# Altium footprint library TYCO THD.PcbLib: 146 footprints (part 10 of 11) (continued)
## TYCO_5747844-5 [mm] "Right Angle 9 Female Contacts D-SUB Connector With PCB Mount Retention , Grounding Straps, and Fixed UNC 4-40 Female Screwlocks" (continued)
  text "9" at 5.75,0.925 h1.2
  text "1" at -7.35,-1.575 h1.2
  text "5" at 6.85,-1.575 h1.2
  text "6" at -6.375,0.925 h1.2
3D body "TYCO_5747844-5.stp": height 12.55, standoff -3.26, extent -15.494,-3.185 15.494,15.71

## TYCO_5748481-6 [mm] "26 Female Contacts, Right Angle High Density D-SUB Connector With Boardlock and 4-40 UNC Female Screwlocks, AMPLIMITE HD-22 Serie"
height 12.75
pads (28):
  round 1.7 hole 1.2: 1(-8.64,-2.54) 2(-6.35,-2.54) 3(-4.06,-2.54) 4(-1.77,-2.54) 5(0.52,-2.54) 6(2.81,-2.54) 7(5.1,-2.54) 8(7.39,-2.54) 9(9.68,-2.54) 10(-9.78,0) 11(-7.49,0) 12(-5.2,0) 13(-2.91,0) 14(-0.62,0) 15(1.67,0) 16(3.96,0) 17(6.25,0) 18(8.54,0) 19(-8.64,2.54) 20(-6.35,2.54) 21(-4.06,2.54) 22(-1.77,2.54) 23(0.52,2.54) 24(2.81,2.54) 25(5.1,2.54) 26(7.39,2.54)
  round 3.9 hole 3.2: 27(-16.66,0) 28(16.66,0)
Top Overlay:
  lines w0.2: -19.6,2.53 -18.285,2.53 -18.285,1.698 ; -19.6,7.33 -13.55,7.33 -13.55,-3.63 ; -19.6,8.53 19.6,8.53 ; -19.6,11.03 19.6,11.03 ; -19.06,11.43 -19.06,17.43 -14.26,17.43 -14.26,11.43 ; -15.035,1.698 -15.035,2.53 -13.55,2.53 ; -13.32,11.43 ccw(c-13.32,12.43) -12.32,12.43 -12.32,16.45 cw(c-11.47,16.45) -11.47,17.3 11.47,17.3 cw(c11.47,16.45) 12.32,16.45 12.32,12.43 ccw(c13.32,12.43) 13.32,11.43 ; -9.436,-3.63 -19.6,-3.63 -19.6,11.43 19.6,11.43 19.6,-3.63 10.476,-3.63 ; 13.55,-3.63 13.55,7.33 19.6,7.33 ; 13.55,2.53 15.035,2.53 15.035,1.698 ; 14.26,11.43 14.26,17.43 19.06,17.43 19.06,11.43 ; 18.285,1.698 18.285,2.53 19.6,2.53
  text "9" at 11.25,-3.04 h1.2
  text "26" at 10.175,1.94 h1.2
  text "18" at 10.175,-0.6 h1.2
  text "10" at -12.95,-0.675 h1.2
  text "19" at -12.95,1.865 h1.2
  text "1" at -11.95,-3 h1.2
Mechanical 8:
  lines w0.1: -17.16,0 -16.66,0 ; -16.66,-0.5 -16.66,0 ; -16.66,0.5 -16.66,0 ; -16.16,0 -16.66,0 ; -10.28,0 -9.78,0 ; -9.78,-0.5 -9.78,0 ; -9.78,0.5 -9.78,0 ; -9.28,0 -9.78,0 ; -9.14,-2.54 -8.64,-2.54 ; -9.14,2.54 -8.64,2.54 ; -8.64,-3.04 -8.64,-2.54 ; -8.64,-2.04 -8.64,-2.54 ; -8.64,2.04 -8.64,2.54 ; -8.64,3.04 -8.64,2.54 ; -8.14,-2.54 -8.64,-2.54 ; -8.14,2.54 -8.64,2.54 ; -7.99,0 -7.49,0 ; -7.49,-0.5 -7.49,0 ; -7.49,0.5 -7.49,0 ; -6.99,0 -7.49,0 ; -6.85,-2.54 -6.35,-2.54 ; -6.85,2.54 -6.35,2.54 ; -6.35,-3.04 -6.35,-2.54 ; -6.35,-2.04 -6.35,-2.54 ; -6.35,2.04 -6.35,2.54 ; -6.35,3.04 -6.35,2.54 ; -5.85,-2.54 -6.35,-2.54 ; -5.85,2.54 -6.35,2.54 ; -5.7,0 -5.2,0 ; -5.2,-0.5 -5.2,0 ; -5.2,0.5 -5.2,0 ; -4.7,0 -5.2,0 ; -4.56,-2.54 -4.06,-2.54 ; -4.56,2.54 -4.06,2.54 ; -4.06,-3.04 -4.06,-2.54 ; -4.06,-2.04 -4.06,-2.54 ; -4.06,2.04 -4.06,2.54 ; -4.06,3.04 -4.06,2.54 ; -3.56,-2.54 -4.06,-2.54 ; -3.56,2.54 -4.06,2.54 ; -3.41,0 -2.91,0 ; -2.91,-0.5 -2.91,0 ; -2.91,0.5 -2.91,0 ; -2.41,0 -2.91,0 ; -2.27,-2.54 -1.77,-2.54 ; -2.27,2.54 -1.77,2.54 ; -1.77,-3.04 -1.77,-2.54 ; -1.77,-2.04 -1.77,-2.54 ; -1.77,2.04 -1.77,2.54 ; -1.77,3.04 -1.77,2.54 ; -1.27,-2.54 -1.77,-2.54 ; -1.27,2.54 -1.77,2.54 ; -1.12,0 -0.62,0 ; -0.62,-0.5 -0.62,0 ; -0.62,0.5 -0.62,0 ; -0.354,-0.354 0,0 ; -0.354,0.354 0,0 ; 0.02,-2.54 0.52,-2.54 ; 0.02,2.54 0.52,2.54 ; 0.354,-0.354 0,0 ; 0.354,0.354 0,0 ; 0.52,-3.04 0.52,-2.54 ; 0.52,-2.04 0.52,-2.54 ; 0.52,2.04 0.52,2.54 ; 0.52,3.04 0.52,2.54 ; 1.02,-2.54 0.52,-2.54 ; 1.02,2.54 0.52,2.54 ; 1.17,0 1.67,0 ; 1.67,-0.5 1.67,0 ; 1.67,0.5 1.67,0 ; 2.17,0 1.67,0 ; 2.31,-2.54 2.81,-2.54 ; 2.31,2.54 2.81,2.54 ; 2.81,-3.04 2.81,-2.54 ; 2.81,-2.04 2.81,-2.54 ; 2.81,2.04 2.81,2.54 ; 2.81,3.04 2.81,2.54 ; 3.31,-2.54 2.81,-2.54 ; 3.31,2.54 2.81,2.54 ; 3.46,0 3.96,0 ; 3.96,-0.5 3.96,0 ; 3.96,0.5 3.96,0 ; 4.46,0 3.96,0 ; 4.6,-2.54 5.1,-2.54 ; 4.6,2.54 5.1,2.54 ; 5.1,-3.04 5.1,-2.54 ; 5.1,-2.04 5.1,-2.54 ; 5.1,2.04 5.1,2.54 ; 5.1,3.04 5.1,2.54 ; 5.6,-2.54 5.1,-2.54 ; 5.6,2.54 5.1,2.54 ; 5.75,0 6.25,0 ; 6.25,-0.5 6.25,0 ; 6.25,0.5 6.25,0 ; 6.75,0 6.25,0 ; 6.89,-2.54 7.39,-2.54 ; 6.89,2.54 7.39,2.54 ; 7.39,-3.04 7.39,-2.54 ; 7.39,-2.04 7.39,-2.54 ; 7.39,2.04 7.39,2.54 ; 7.39,3.04 7.39,2.54 ; 7.89,-2.54 7.39,-2.54 ; 7.89,2.54 7.39,2.54 ; 8.04,0 8.54,0 ; 8.54,-0.5 8.54,0 ; 8.54,0.5 8.54,0 ; 9.04,0 8.54,0 ; 9.18,-2.54 9.68,-2.54 ; 9.68,-3.04 9.68,-2.54 ; 9.68,-2.04 9.68,-2.54 ; 10.18,-2.54 9.68,-2.54 ; 16.16,0 16.66,0 ; 16.66,-0.5 16.66,0 ; 16.66,0.5 16.66,0 ; 17.16,0 16.66,0
Mechanical 14:
  lines w0.1: -19.6,2.53 -18.285,2.53 -18.285,-0.3 ; -19.6,7.33 -13.55,7.33 -13.55,-3.63 ; -19.6,8.53 19.6,8.53 ; -19.6,11.03 19.6,11.03 ; -19.06,11.43 -19.06,17.43 -14.26,17.43 -14.26,11.43 ; -18.285,0.3 -18.535,0.3 -18.535,0.625 cw(c-16.66,0.625) -18.285,1.56 ; -17.16,2.03 -17.16,-0.3 -18.285,-0.3 ; -17.154,1.951 cw(c-16.658,2.001) -16.16,2.03 -16.16,-0.3 -15.035,-0.3 ; -15.035,0.3 -14.785,0.3 -14.785,0.625 ccw(c-16.66,0.625) -15.035,1.56 ; -13.55,2.53 -15.035,2.53 -15.035,-0.3 ; -13.32,11.43 ccw(c-13.32,12.43) -12.32,12.43 -12.32,16.45 cw(c-11.47,16.45) -11.47,17.3 11.47,17.3 cw(c11.47,16.45) 12.32,16.45 12.32,12.43 ccw(c13.32,12.43) 13.32,11.43 ; 13.55,-3.63 13.55,7.33 19.6,7.33 ; 13.55,2.53 15.035,2.53 15.035,-0.3 ; 14.26,11.43 14.26,17.43 19.06,17.43 19.06,11.43 ; 15.035,0.3 14.785,0.3 14.785,0.625 cw(c16.66,0.625) 15.035,1.56 ; 18.285,0.3 18.535,0.3 18.535,0.625 ccw(c16.66,0.625) 18.285,1.56 ; 19.6,2.53 18.285,2.53 18.285,-0.3 ; -18.285,-0.3 -18.535,-0.3 -18.535,-0.625 ccw(c-16.66,-0.625) -14.785,-0.625 -14.785,-0.3 -15.035,-0.3 ; 15.035,-0.3 16.16,-0.3 16.16,2.03 cw(c16.66,2.03) 17.16,2.03 17.16,-0.3 18.285,-0.3 ; 15.035,-0.3 14.785,-0.3 14.785,-0.625 ccw(c16.66,-0.625) 18.535,-0.625 18.535,-0.3 18.285,-0.3 ; -19.6,-3.63 19.6,-3.63 19.6,11.43 -19.6,11.43 -19.6,-3.63
3D body "TYCO_5748481-6.stp": height 12.5, standoff -4.35, extent -19.6,-3.63 19.6,17.43

## TYCO_5748483-5 [mm] "Right Angle D-SUB 78 Female Contacts, Shell Size 5, With Boardlock and Threaded Insert,(4-40 UNC), HD-22 Serie"
height 15.55
pads (80):
  round 1.9 hole 1.2: 1(22.87,3.965) 2(20.46,3.965) 3(18.05,3.965) 4(15.64,3.965) 5(13.23,3.965) 6(10.82,3.965) 7(8.41,3.965) 8(6,3.965) 9(3.59,3.965) 10(1.18,3.965) 11(-1.23,3.965) 12(-3.64,3.965) 13(-6.05,3.965) 14(-8.46,3.965) 15(-10.87,3.965) 16(-13.28,3.965) 17(-15.69,3.965) 18(-18.1,3.965) 19(-20.51,3.965) 20(-22.92,3.965) 21(21.67,1.425) 22(19.26,1.425) 23(16.85,1.425) 24(14.44,1.425) 25(12.03,1.425) 26(9.62,1.425) 27(7.21,1.425) 28(4.8,1.425) 29(2.39,1.425) 30(-0.02,1.425) 31(-2.43,1.425) 32(-4.84,1.425) 33(-7.25,1.425) 34(-9.66,1.425) 35(-12.07,1.425) 36(-14.48,1.425) 37(-16.89,1.425) 38(-19.3,1.425) 39(-21.71,1.425) 40(22.87,-1.115) 41(20.46,-1.115) 42(18.05,-1.115) 43(15.64,-1.115) 44(13.23,-1.115) 45(10.82,-1.115) 46(8.41,-1.115) 47(6,-1.115) 48(3.59,-1.115) 49(1.18,-1.115) 50(-1.23,-1.115) 51(-3.64,-1.115) 52(-6.05,-1.115) 53(-8.46,-1.115) 54(-10.87,-1.115) 55(-13.28,-1.115) 56(-15.69,-1.115) 57(-18.1,-1.115) 58(-20.51,-1.115) 59(-22.92,-1.115) 60(21.67,-3.655) 61(19.26,-3.655) 62(16.85,-3.655) 63(14.44,-3.655) 64(12.03,-3.655) 65(9.62,-3.655) 66(7.21,-3.655) 67(4.8,-3.655) 68(2.39,-3.655) 69(-0.02,-3.655) 70(-2.43,-3.655) 71(-4.84,-3.655) 72(-7.25,-3.655) 73(-9.66,-3.655) 74(-12.07,-3.655) 75(-14.48,-3.655) 76(-16.89,-3.655) 77(-19.3,-3.655) 78(-21.71,-3.655)
  round 5.5 hole 3.2: 79(-30.55,-1.115) 80(30.5,-1.115)
Top Overlay:
  lines w0.2: -33.5,-9.405 33.5,-9.405 ; -33.5,-8.645 -27.47,-8.645 -27.47,-1.775 ; -33.5,-2.22 -33.5,-12.545 33.5,-12.545 33.5,-2.075 ; -33.5,-0.01 -33.5,5.055 -23.717,5.055 ; -33,-8.645 -33,-3.095 ; -32.325,1.487 -32.325,5.055 ; -31.925,-12.545 -31.925,-9.405 ; -28.675,1.416 -28.675,5.055 ; -28,-8.645 -28,-2.964 ; -27.47,-0.455 -27.47,5.055 ; -26.913,-12.545 cw(c-26.913,-13.358) -26.1,-13.358 ; -23.052,-18.645 -23.052,-12.545 ; 22,-18.645 22,-18.745 22.75,-18.745 22.75,-18.645 ; 22.021,-18.745 22.021,-18.645 ; 22.063,-18.745 22.063,-18.645 ; 22.125,-18.745 22.125,-18.645 ; 22.229,-18.745 22.229,-18.645 ; 22.333,-18.745 22.333,-18.645 ; 22.417,-18.745 22.417,-18.645 ; 22.521,-18.745 22.521,-18.645 ; 22.625,-18.745 22.625,-18.645 ; 22.688,-18.745 22.688,-18.645 ; 22.708,-18.745 22.708,-18.645 ; 22.8,-18.645 22.8,-18.745 23.967,-18.745 23.967,-18.645 ; 22.821,-18.745 22.821,-18.645 ; 22.842,-18.745 22.842,-18.645 ; 22.925,-18.745 22.925,-18.645 ; 23.008,-18.745 23.008,-18.645 ; 23.052,-18.645 23.052,-12.545 ; 23.154,-18.745 23.154,-18.645 ; 23.238,-18.745 23.238,-18.645 ; 23.363,-18.745 23.363,-18.645 ; 23.446,-18.745 23.446,-18.645 ; 23.529,-18.745 23.529,-18.645 ; 23.55,-18.745 23.55,-18.645 ; 23.625,-18.745 23.625,-18.645 ; 23.667,5.055 33.5,5.055 33.5,-0.155 ; 23.717,-18.745 23.717,-18.645 ; 23.842,-18.745 23.842,-18.645 ; 24,-18.645 24,-18.745 24.75,-18.745 24.75,-18.645 ; 24.021,-18.745 24.021,-18.645 ; 24.042,-18.745 24.042,-18.645 ; 24.083,-18.745 24.083,-18.645 ; 24.1,-18.745 24.1,-18.645 ; 24.225,-18.745 24.225,-18.645 ; 24.35,-18.745 24.35,-18.645 ; 24.375,-18.745 24.375,-18.645 ; 24.5,-18.745 24.5,-18.645 ; 24.604,-18.745 24.604,-18.645 ; 24.667,-18.745 24.667,-18.645 ; 24.708,-18.745 24.708,-18.645 ; 24.729,-18.745 24.729,-18.645 ; 26.913,-12.545 ccw(c26.913,-13.358) 26.1,-13.358 ; 27.47,-1.976 27.47,-8.645 33.5,-8.645 ; 27.47,-0.254 27.47,5.055 ; 28,-8.645 28,-3.031 ; 28.675,1.452 28.675,5.055 ; 31.925,-12.545 31.925,-9.405 ; 32.325,1.452 32.325,5.055 ; 33,-8.645 33,-3.031 ; -26.1,-17.82 ccw(c-24.83,-17.82) -25.795,-18.645 25.795,-18.645 ccw(c24.83,-17.82) 26.1,-17.82 ; -26.1,-17.82 26.1,-17.82 ; -26.1,-17.82 -26.1,-13.358 ; -26.1,-13.358 26.1,-13.358 ; 26.1,-17.82 26.1,-13.358
  text "20" at -26.629,2.923 h1.2
  text "78" at -25.954,-4.44 h1.2
  text "1" at 24.846,2.963 h1.2
  text "39" at -25.979,0.56 h1.2
  text "59" at -26.733,-1.94 h1.2
  text "21" at 23.596,0.623 h1.2
  text "40" at 24.471,-1.827 h1.2
  text "60" at 23.446,-4.402 h1.2
Mechanical 8:
  drawing of 168 lines, arcs and shapes, not listed
Mechanical 14:
  lines w0.1: -33.5,-9.405 33.5,-9.405 ; -33.5,-8.645 -27.47,-8.645 -27.47,5.055 ; -33,-8.645 -33,-1.115 -31.5,-1.115 -31.5,-0.815 ; -32.325,-1.115 -32.325,5.055 ; -32.325,-0.39 cw(c-30.5,-0.39) -28.675,-0.39 ; -32.155,-1.115 -32.155,-0.815 -30.775,-0.815 -30.775,-1.115 -30.225,-1.115 -30.225,-0.815 -28.845,-0.815 -28.845,-1.115 ; -31.925,-12.545 -31.925,-9.405 ; -31.764,-1.115 -31.764,-0.815 ; -31.68,-1.115 -31.68,-0.815 ; -29.5,-0.815 -29.5,-1.115 -28,-1.115 -28,-8.645 ; -29.32,-1.115 -29.32,-0.815 ; -29.236,-1.115 -29.236,-0.815 ; -28.675,-1.115 -28.675,5.055 ; -26.913,-12.545 cw(c-26.913,-13.358) -26.1,-13.358 ; -23.052,-18.645 -23.052,-12.545 ; 22,-18.645 22,-18.745 22.75,-18.745 22.75,-18.645 ; 22.021,-18.745 22.021,-18.645 ; 22.063,-18.745 22.063,-18.645 ; 22.125,-18.745 22.125,-18.645 ; 22.229,-18.745 22.229,-18.645 ; 22.333,-18.745 22.333,-18.645 ; 22.417,-18.745 22.417,-18.645 ; 22.521,-18.745 22.521,-18.645 ; 22.625,-18.745 22.625,-18.645 ; 22.688,-18.745 22.688,-18.645 ; 22.708,-18.745 22.708,-18.645 ; 22.8,-18.645 22.8,-18.745 23.967,-18.745 23.967,-18.645 ; 22.821,-18.745 22.821,-18.645 ; 22.842,-18.745 22.842,-18.645 ; 22.925,-18.745 22.925,-18.645 ; 23.008,-18.745 23.008,-18.645 ; 23.052,-18.645 23.052,-12.545 ; 23.154,-18.745 23.154,-18.645 ; 23.238,-18.745 23.238,-18.645 ; 23.363,-18.745 23.363,-18.645 ; 23.446,-18.745 23.446,-18.645 ; 23.529,-18.745 23.529,-18.645 ; 23.55,-18.745 23.55,-18.645 ; 23.625,-18.745 23.625,-18.645 ; 23.717,-18.745 23.717,-18.645 ; 23.842,-18.745 23.842,-18.645 ; 24,-18.645 24,-18.745 24.75,-18.745 24.75,-18.645 ; 24.021,-18.745 24.021,-18.645 ; 24.042,-18.745 24.042,-18.645 ; 24.083,-18.745 24.083,-18.645 ; 24.1,-18.745 24.1,-18.645 ; 24.225,-18.745 24.225,-18.645 ; 24.35,-18.745 24.35,-18.645 ; 24.375,-18.745 24.375,-18.645 ; 24.5,-18.745 24.5,-18.645 ; 24.604,-18.745 24.604,-18.645 ; 24.667,-18.745 24.667,-18.645 ; 24.708,-18.745 24.708,-18.645 ; 24.729,-18.745 24.729,-18.645 ; 26.913,-12.545 ccw(c26.913,-13.358) 26.1,-13.358 ; 27.47,5.055 27.47,-8.645 33.5,-8.645 ; 28,-8.645 28,-1.115 29.5,-1.115 29.5,-0.815 ; 28.675,-1.115 28.675,5.055 ; 28.675,-0.39 cw(c30.5,-0.39) 32.325,-0.39 ; 28.845,-1.115 28.845,-0.815 30.225,-0.815 30.225,-1.115 30.775,-1.115 30.775,-0.815 32.155,-0.815 32.155,-1.115 ; 29.236,-1.115 29.236,-0.815 ; 29.32,-1.115 29.32,-0.815 ; 31.5,-0.815 31.5,-1.115 33,-1.115 33,-8.645 ; 31.68,-1.115 31.68,-0.815 ; 31.764,-1.115 31.764,-0.815 ; 31.925,-12.545 31.925,-9.405 ; 32.325,-1.115 32.325,5.055 ; -26.1,-17.82 ccw(c-24.83,-17.82) -25.795,-18.645 25.795,-18.645 ccw(c24.83,-17.82) 26.1,-17.82 ; -26.1,-17.82 26.1,-17.82 ; -26.1,-17.82 -26.1,-13.358 ; -26.1,-13.358 26.1,-13.358 ; 26.1,-17.82 26.1,-13.358 ; -33.5,-12.545 33.5,-12.545 33.5,5.055 -33.5,5.055 -33.5,-12.545
  text "20" at -26.629,2.923 h1.2
  text "78" at -25.954,-4.44 h1.2
  text "1" at 24.846,2.963 h1.2
  text "39" at -25.979,0.56 h1.2
  text "59" at -26.733,-1.94 h1.2
  text "21" at 23.596,0.623 h1.2
  text "40" at 24.471,-1.827 h1.2
  text "60" at 23.446,-4.402 h1.2
3D body "TYCO_5748483-5.stp": height 15.3, standoff -3.5, extent -33.5,-18.745 33.5,5.055

## TYCO_5749768-1 [mm] "15 Male Contacts, Right Angle High Density D-SUB Connector With Boardlock and Threaded Insert (4-40 UNC), AMPLIMITE HD-22 Series"
height 12.88
pads (17):
  round 1.7 hole 1.2: 1(4.33,-2.54) 2(2.04,-2.54) 3(-0.25,-2.54) 4(-2.54,-2.54) 5(-4.83,-2.54) 6(5.47,0) 7(3.18,0) 8(0.89,0) 9(-1.4,0) 10(-3.69,0) 11(4.33,2.54) 12(2.04,2.54) 13(-0.25,2.54) 14(-2.54,2.54) 15(-4.83,2.54)
  round 3.9 hole 3.2: 16(-12.5,0) 17(12.49,0)
Top Overlay:
  lines w0.2: -15.41,7.18 -9.305,7.18 -9.305,-3.63 ; -15.41,9.03 15.4,9.03 ; -15.1,7.18 -15.1,6.73 ccw(c-14.099,6.73) -14.099,5.729 -10.899,5.731 ccw(c-10.899,6.73) -9.9,6.73 -9.9,7.18 ; -15,7.18 -15,6.83 -10,6.83 -10,7.18 ; -14.9,11.43 -14.9,17.43 -10.1,17.43 -10.1,11.43 ; -14.35,1.449 -14.35,3.68 cw(c-12.5,3.68) -13.994,4.771 ; -13.994,1.814 -13.994,5.731 ; -13.094,2.274 -13.094,4.759 cw(c-12.494,4.759) -11.894,4.759 -11.894,2.271 ; -10.994,1.804 -10.994,5.731 ; -10.994,4.754 cw(c-12.5,3.68) -10.65,3.68 -10.65,1.449 ; -8.965,11.43 -8.965,16.93 cw(c-8.465,16.93) -8.465,17.43 8.455,17.43 cw(c8.455,16.93) 8.955,16.93 8.955,11.43 ; -7.67,-3.63 -15.41,-3.63 -15.41,11.03 ; 7.66,-3.63 15.4,-3.63 15.4,11.03 ; 9.295,-3.63 9.295,7.18 15.4,7.18 ; 9.89,7.18 9.89,6.73 ccw(c10.891,6.73) 10.891,5.729 14.091,5.731 ccw(c14.091,6.73) 15.09,6.73 15.09,7.18 ; 9.99,7.18 9.99,6.83 14.99,6.83 14.99,7.18 ; 10.09,11.43 10.09,17.43 14.89,17.43 14.89,11.43 ; 10.64,1.449 10.64,3.68 cw(c12.49,3.68) 10.996,4.771 ; 10.996,1.814 10.996,5.731 ; 11.896,2.274 11.896,4.759 cw(c12.496,4.759) 13.096,4.759 13.096,2.271 ; 13.996,1.804 13.996,5.731 ; 13.996,4.754 cw(c12.49,3.68) 14.34,3.68 14.34,1.449 ; -15.41,11.03 15.4,11.03 ; -15.41,11.03 -15.41,11.43 15.4,11.43 15.4,11.03
  text "5" at -7.175,-3.05 h1.2
  text "15" at -8.35,2 h1.2
  text "10" at -7,-0.55 h1.2
  text "6" at 7.2,-0.625 h1.2
  text "11" at 5.85,2.075 h1.2
  text "1" at 5.95,-3.125 h1.2
Mechanical 8:
  lines w0.1: -13,0 -12.5,0 ; -12.5,-0.5 -12.5,0 ; -12.5,0.5 -12.5,0 ; -12,0 -12.5,0 ; -5.33,-2.54 -4.83,-2.54 ; -5.33,2.54 -4.83,2.54 ; -4.83,-3.04 -4.83,-2.54 ; -4.83,-2.04 -4.83,-2.54 ; -4.83,2.04 -4.83,2.54 ; -4.83,3.04 -4.83,2.54 ; -4.33,-2.54 -4.83,-2.54 ; -4.33,2.54 -4.83,2.54 ; -4.19,0 -3.69,0 ; -3.69,-0.5 -3.69,0 ; -3.69,0.5 -3.69,0 ; -3.19,0 -3.69,0 ; -3.04,-2.54 -2.54,-2.54 ; -3.04,2.54 -2.54,2.54 ; -2.54,-3.04 -2.54,-2.54 ; -2.54,-2.04 -2.54,-2.54 ; -2.54,2.04 -2.54,2.54 ; -2.54,3.04 -2.54,2.54 ; -2.04,-2.54 -2.54,-2.54 ; -2.04,2.54 -2.54,2.54 ; -1.9,0 -1.4,0 ; -1.4,-0.5 -1.4,0 ; -1.4,0.5 -1.4,0 ; -0.9,0 -1.4,0 ; -0.75,-2.54 -0.25,-2.54 ; -0.75,2.54 -0.25,2.54 ; -0.354,-0.354 0,0 ; -0.354,0.354 0,0 ; -0.25,-3.04 -0.25,-2.54 ; -0.25,-2.04 -0.25,-2.54 ; -0.25,2.04 -0.25,2.54 ; -0.25,3.04 -0.25,2.54 ; 0.25,-2.54 -0.25,-2.54 ; 0.25,2.54 -0.25,2.54 ; 0.354,-0.354 0,0 ; 0.354,0.354 0,0 ; 0.39,0 0.89,0 ; 0.89,-0.5 0.89,0 ; 0.89,0.5 0.89,0 ; 1.39,0 0.89,0 ; 1.54,-2.54 2.04,-2.54 ; 1.54,2.54 2.04,2.54 ; 2.04,-3.04 2.04,-2.54 ; 2.04,-2.04 2.04,-2.54 ; 2.04,2.04 2.04,2.54 ; 2.04,3.04 2.04,2.54 ; 2.54,-2.54 2.04,-2.54 ; 2.54,2.54 2.04,2.54 ; 2.68,0 3.18,0 ; 3.18,-0.5 3.18,0 ; 3.18,0.5 3.18,0 ; 3.68,0 3.18,0 ; 3.83,-2.54 4.33,-2.54 ; 3.83,2.54 4.33,2.54 ; 4.33,-3.04 4.33,-2.54 ; 4.33,-2.04 4.33,-2.54 ; 4.33,2.04 4.33,2.54 ; 4.33,3.04 4.33,2.54 ; 4.83,-2.54 4.33,-2.54 ; 4.83,2.54 4.33,2.54 ; 4.97,0 5.47,0 ; 5.47,-0.5 5.47,0 ; 5.47,0.5 5.47,0 ; 5.97,0 5.47,0 ; 11.99,0 12.49,0 ; 12.49,-0.5 12.49,0 ; 12.49,0.5 12.49,0 ; 12.99,0 12.49,0
Mechanical 14:
  lines w0.1: -15.41,7.18 -9.305,7.18 -9.305,-3.63 ; -15.41,9.03 15.4,9.03 ; -15.1,7.18 -15.1,6.73 ccw(c-14.099,6.73) -14.099,5.729 -10.899,5.731 ccw(c-10.899,6.73) -9.9,6.73 -9.9,7.18 ; -15,7.18 -15,6.83 -10,6.83 -10,7.18 ; -14.9,11.43 -14.9,17.43 -10.1,17.43 -10.1,11.43 ; -14.35,0.3 -13.994,0.3 ; -14.333,-0.3 -13.094,-0.3 -13.094,4.759 cw(c-12.494,4.759) -11.894,4.759 -11.894,-0.3 -10.667,-0.3 ; -13.994,-0.3 -13.994,5.731 ; -13.994,4.771 ccw(c-12.5,3.68) -14.35,3.68 -14.35,-0.05 ccw(c-12.5,-0.05) -10.65,-0.05 -10.65,3.68 ccw(c-12.5,3.68) -10.994,4.754 ; -10.994,-0.3 -10.994,5.731 ; -10.994,0.3 -10.65,0.3 ; -8.965,11.43 -8.965,16.93 cw(c-8.465,16.93) -8.465,17.43 8.455,17.43 cw(c8.455,16.93) 8.955,16.93 8.955,11.43 ; 9.295,-3.63 9.295,7.18 15.4,7.18 ; 9.89,7.18 9.89,6.73 ccw(c10.891,6.73) 10.891,5.729 14.091,5.731 ccw(c14.091,6.73) 15.09,6.73 15.09,7.18 ; 9.99,7.18 9.99,6.83 14.99,6.83 14.99,7.18 ; 10.09,11.43 10.09,17.43 14.89,17.43 14.89,11.43 ; 10.64,0.3 10.996,0.3 ; 10.657,-0.3 11.896,-0.3 11.896,4.759 cw(c12.496,4.759) 13.096,4.759 13.096,-0.3 14.323,-0.3 ; 10.996,-0.3 10.996,5.731 ; 10.996,4.771 ccw(c12.49,3.68) 10.64,3.68 10.64,-0.05 ccw(c12.49,-0.05) 14.34,-0.05 14.34,3.68 ccw(c12.49,3.68) 13.996,4.754 ; 13.996,-0.3 13.996,5.731 ; 13.996,0.3 14.34,0.3 ; -15.41,11.03 15.4,11.03 ; -15.41,11.03 -15.41,11.43 15.4,11.43 15.4,11.03 ; -15.41,11.03 -15.41,-3.63 15.4,-3.63 15.4,11.03
  text "1" at 5.95,-3.125 h1.2
  text "11" at 5.85,2.075 h1.2
  text "6" at 7.2,-0.625 h1.2
  text "10" at -7,-0.55 h1.2
  text "15" at -8.35,2 h1.2
  text "5" at -7.175,-3.05 h1.2
3D body "TYCO_5749768-1.stp": height 12.5, standoff -3.78, extent -15.41,-3.63 15.4,17.43

## TYCO_5786555-7 [mm] "AMPLIMITE .050 Series, 68 Positions Vertical Receptacle, with ACTION PIN Tails (Press-Fit), Series III"
height 8.71
pads (70):
  round 1.3 hole 0.6: 1(20.955,0.953) 2(19.685,2.858) 3(18.415,0.953) 4(17.145,2.858) 5(15.875,0.953) 6(14.605,2.858) 7(13.335,0.953) 8(12.065,2.858) 9(10.795,0.953) 10(9.525,2.858) 11(8.255,0.953) 12(6.985,2.858) 13(5.715,0.953) 14(4.445,2.858) 15(3.175,0.953) 16(1.905,2.858) 17(0.635,0.953) 18(-0.635,2.858) 19(-1.905,0.953) 20(-3.175,2.858) 21(-4.445,0.953) 22(-5.715,2.858) 23(-6.985,0.953) 24(-8.255,2.858) 25(-9.525,0.953) 26(-10.795,2.858) 27(-12.065,0.953) 28(-13.335,2.858) 29(-14.605,0.953) 30(-15.875,2.858) 31(-17.145,0.953) 32(-18.415,2.858) 33(-19.685,0.953) 34(-20.955,2.858) 35(20.955,-2.858) 36(19.685,-0.953) 37(18.415,-2.858) 38(17.145,-0.953) 39(15.875,-2.858) 40(14.605,-0.953) 41(13.335,-2.858) 42(12.065,-0.953) 43(10.795,-2.858) 44(9.525,-0.953) 45(8.255,-2.858) 46(6.985,-0.953) 47(5.715,-2.858) 48(4.445,-0.953) 49(3.175,-2.858) 50(1.905,-0.953) 51(0.635,-2.858) 52(-0.635,-0.953) 53(-1.905,-2.858) 54(-3.175,-0.953) 55(-4.445,-2.858) 56(-5.715,-0.953) 57(-6.985,-2.858) 58(-8.255,-0.953) 59(-9.525,-2.858) 60(-10.795,-0.953) 61(-12.065,-2.858) 62(-13.335,-0.953) 63(-14.605,-2.858) 64(-15.875,-0.953) 65(-17.145,-2.858) 66(-18.415,-0.953) 67(-19.685,-2.858) 68(-20.955,-0.953)
  round 3.9 / inner round 3.9 / far side round 5.6 hole 3.2: 69(-28.955,0) 70(28.956,0)
Top Overlay:
  lines w0.2: -31.94,-1.525 -31.94,-5.156 31.941,-5.156 31.941,-1.525 ; -31.94,1.525 -31.94,5.156 31.941,5.156 31.941,1.525 ; -22.042,2.769 -22.113,2.769 ccw(c-22.113,1.778) -23.07,1.522 -22.117,-2.034 ccw(c-21.16,-1.778) -21.16,-2.769 -20.772,-2.769 ; 20.691,2.769 22.032,2.769 cw(c22.032,1.778) 22.989,1.522 22.036,-2.034 cw(c21.079,-1.778) 21.856,-2.393
  text "68" at -25.23,-1.508 h1.2
  text "67" at -24.935,-3.428 h1.2
  text "34" at -25.735,0.653 h1.2
  text "33" at -26.071,2.683 h1.2
  text "36" at 23.215,-1.533 h1.2
  text "35" at 22.764,-3.653 h1.2
  text "2" at 21.043,3.453 h1.2
  text "1" at 24.1,0.807 h1.2
Mechanical 8:
  drawing of 285 lines, arcs and shapes, not listed
Mechanical 14:
  drawing of 831 lines, arcs and shapes, not listed
  text "68" at -25.23,-1.508 h1.2
  text "67" at -24.935,-3.428 h1.2
  text "34" at -25.735,0.653 h1.2
  text "33" at -26.071,2.683 h1.2
  text "36" at 23.215,-1.533 h1.2
  text "35" at 22.764,-3.653 h1.2
  text "2" at 21.043,3.453 h1.2
  text "1" at 24.1,0.807 h1.2
Drill Drawing:
  lines w0.1: -19,5.156 -22.4,5.156 -22.4,-4 22.4,-4 22.4,5.156 19,5.156
  text "PRESS-FIT TECHNOLOGY diam. 0.6mm +0.06 -0.04" at -18.35,4.125 h1.2
3D body "TYCO_5786555-7.stp": height 8.71, standoff -4.39, extent -31.94,-5.156 31.941,5.156

## TYCO_5787082-7 [mm] "68 contacts, AMPLIMITE .050\", Right Angled Receptacle Series III"
height 9.5
pads (70):
  round 1.6 hole 0.9: 1(20.955,0.952) 2(19.685,2.857) 3(18.415,0.952) 4(17.145,2.857) 5(15.875,0.952) 6(14.605,2.857) 7(13.335,0.952) 8(12.065,2.858) 9(10.795,0.952) 10(9.525,2.857) 11(8.255,0.952) 12(6.985,2.857) 13(5.715,0.952) 14(4.445,2.857) 15(3.175,0.952) 16(1.905,2.857) 17(0.635,0.952) 18(-0.635,2.857) 19(-1.905,0.952) 20(-3.175,2.857) 21(-4.445,0.952) 22(-5.715,2.857) 23(-6.985,0.952) 24(-8.255,2.857) 25(-9.525,0.952) 26(-10.795,2.857) 27(-12.065,0.952) 28(-13.335,2.857) 29(-14.605,0.952) 30(-15.875,2.857) 31(-17.145,0.952) 32(-18.415,2.857) 33(-19.685,0.952) 34(-20.955,2.857) 35(20.955,-2.858) 36(19.685,-0.953) 37(18.415,-2.858) 38(17.145,-0.953) 39(15.875,-2.858) 40(14.605,-0.953) 41(13.335,-2.858) 42(12.065,-0.953) 43(10.795,-2.858) 44(9.525,-0.953) 45(8.255,-2.858) 46(6.985,-0.953) 47(5.715,-2.858) 48(4.445,-0.953) 49(3.175,-2.858) 50(1.905,-0.953) 51(0.635,-2.858) 52(-0.635,-0.953) 53(-1.905,-2.858) 54(-3.175,-0.953) 55(-4.445,-2.858) 56(-5.715,-0.953) 57(-6.985,-2.858) 58(-8.255,-0.953) 59(-9.525,-2.858) 60(-10.795,-0.953) 61(-12.065,-2.858) 62(-13.335,-0.953) 63(-14.605,-2.858) 64(-15.875,-0.953) 65(-17.145,-2.858) 66(-18.415,-0.953) 67(-19.685,-2.858) 68(-20.955,-0.953)
  round 3.5 hole 2.8: 69(-28.955,-0.953) 70(28.955,-0.953)
Top Overlay:
  circle w0.3: c24.245,4.902 r0.15
  lines w0.2: -31.92,-6.845 31.92,-6.845 ; -31.92,-4.635 31.92,-4.635 ; -27.241,-4.635 -27.241,-2.167 ; -27.241,0.262 -27.241,4.127 ; -25.845,-11.138 -26.86,-11.138 -26.86,-11.265 -25.845,-12.738 ; -25.845,-7.633 -25.845,-12.738 ; -25.845,-4.635 -25.845,4.127 ; -25.845,-3.932 -25.082,-3.492 -25.082,-2.349 -25.845,-1.91 ; -24.511,-7.633 -24.511,-12.738 -25.845,-12.738 ; -24.003,-4.635 -24.003,-3.9 ; -24.003,3.808 -24.003,4.127 ; -23.096,-7.633 -23.063,-12.535 23.063,-12.535 23.063,-7.633 ; -22.858,-12.535 -22.859,-12.636 22.858,-12.636 22.858,-12.535 ; 24.003,-1.903 24.003,4.127 ; 24.003,-1.46 25.845,-1.46 ; 24.511,-7.633 24.511,-12.738 25.845,-12.738 ; 25.845,-11.138 26.86,-11.138 26.86,-11.265 25.845,-12.738 ; 25.845,-7.633 25.845,-12.738 ; 25.845,-4.635 25.845,4.127 ; 25.845,-3.932 25.082,-3.492 25.082,-2.349 25.845,-1.91 ; 27.241,-4.635 27.241,-2.167 ; 27.241,0.262 27.241,4.127 ; -31.941,-7.633 -31.941,3.111 cw(c-30.924,3.111) -30.925,4.127 30.924,4.127 cw(c30.924,3.111) 31.941,3.112 31.941,-7.633 -31.941,-7.633
  text "33" at -23.655,0.387 h1
  text "68" at -24.255,-1.613 h1
  text "67" at -23.355,-3.362 h1
  text "34" at -24.455,2.337 h1
  text "35" at 22.395,-3.498 h1
  text "2" at 21.495,2.402 h1
  text "1" at 22.395,0.452 h1
  text "36" at 21.495,-1.348 h1
Mechanical 8:
  drawing of 290 lines, arcs and shapes, not listed
  text "PCB Edge" at -4.325,-6.202 h1.2
Mechanical 14:
  lines w0.1: -31.92,-6.845 31.92,-6.845 ; -31.92,-4.635 31.92,-4.635 ; -27.241,-4.635 -27.241,4.127 ; -25.845,-11.138 -26.86,-11.138 -26.86,-11.265 -25.845,-12.738 ; -25.845,-7.633 -25.845,-12.738 ; -25.845,-4.635 -25.845,4.127 ; -25.845,-3.932 -25.082,-3.492 -25.082,-2.349 -25.845,-1.91 ; -25.845,-1.46 -24.003,-1.46 ; -24.511,-7.633 -24.511,-12.738 -25.845,-12.738 ; -24.003,-4.635 -24.003,4.127 ; -23.096,-7.633 -23.063,-12.535 23.063,-12.535 23.063,-7.633 ; -22.858,-12.535 -22.859,-12.636 22.858,-12.636 22.858,-12.535 ; 24.003,-4.635 24.003,4.127 ; 24.003,-1.46 25.845,-1.46 ; 24.511,-7.633 24.511,-12.738 25.845,-12.738 ; 25.845,-11.138 26.86,-11.138 26.86,-11.265 25.845,-12.738 ; 25.845,-7.633 25.845,-12.738 ; 25.845,-4.635 25.845,4.127 ; 25.845,-3.932 25.082,-3.492 25.082,-2.349 25.845,-1.91 ; 27.241,-4.635 27.241,4.127 ; -31.941,-7.633 -31.941,3.111 cw(c-30.924,3.111) -30.925,4.127 30.924,4.127 cw(c30.924,3.111) 31.941,3.112 31.941,-7.633 -31.941,-7.633
  text "33" at -23.655,0.387 h1.02
  text "68" at -24.255,-1.613 h1.02
  text "67" at -23.355,-3.362 h1.02
  text "34" at -24.455,2.337 h1.02
  text "35" at 22.395,-3.498 h1.02
  text "2" at 21.495,2.402 h1.02
  text "1" at 22.395,0.452 h1.02
  text "36" at 21.495,-1.348 h1.02
3D body "TYCO_5787082-7.stp": height 9.5, standoff -3.81, extent -31.94,-12.738 31.941,4.128